# Altium footprint library Metric_SMD.PcbLib: 185 footprints (part 4 of 12)
Each footprint in its own frame and in the unit in brackets; x right, y up, seen from the top. Pads: shape width x height; smd on the part's side, far side on the other; paste and mask are expansions set on the pad; w line width, h text height; cw(c..) or ccw(c..) is an arc to the next point about the centre after c.
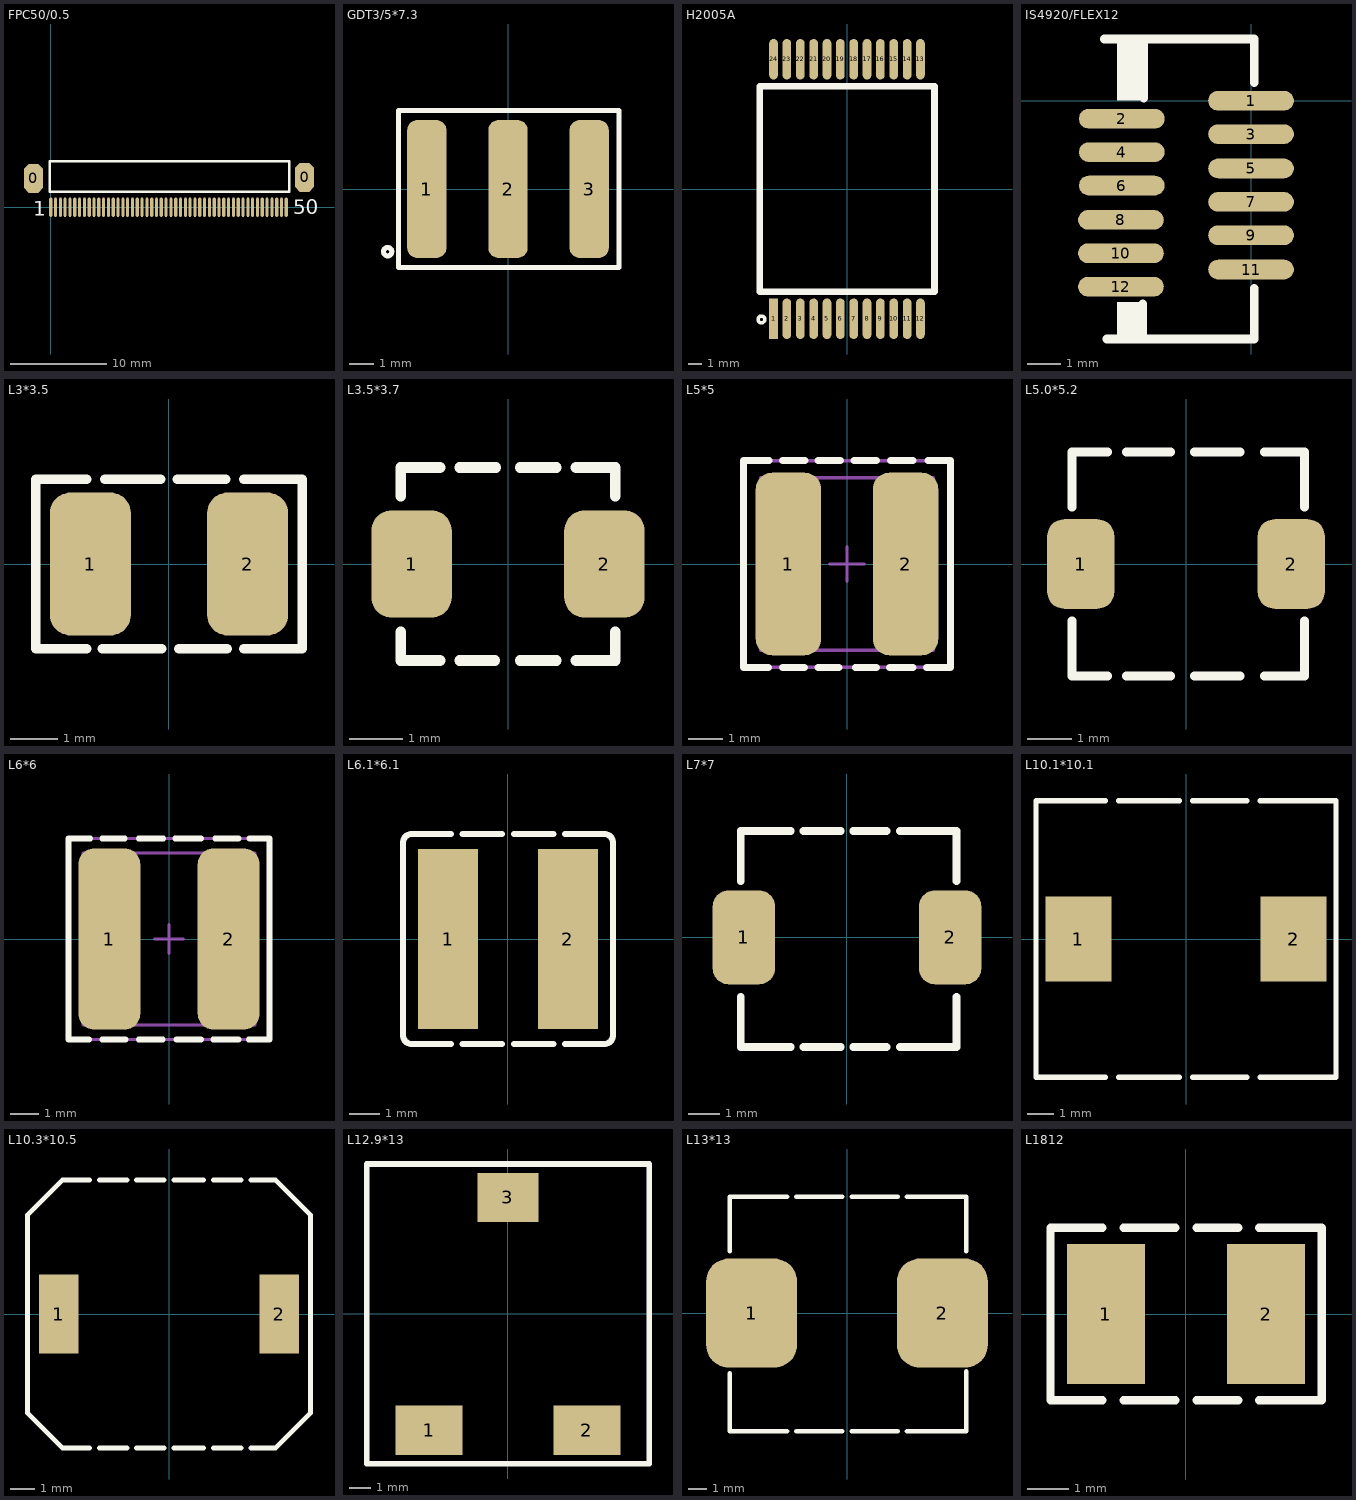
[diagram p3: the footprints below, top view; thin cyan lines are the x and y axes]

## FPC50/0.5 [mm] "FPC50pin,Single,0.5mm pitch"
height 1.5
pads (52):
  oct 2x3 smd: 0(-1.8,3) 0(26.4,3.1)
  oct 0.33x2 smd: 1(0,0) 2(0.5,0) 3(1,0) 4(1.5,0) 5(2,0) 6(2.5,0) 7(3,0) 8(3.5,0) 9(4,0) 10(4.5,0) 11(5,0) 12(5.5,0) 13(6,0) 14(6.5,0) 15(7,0) 16(7.5,0) 17(8,0) 18(8.5,0) 19(9,0) 20(9.5,0) 21(10,0) 22(10.5,0) 23(11,0) 24(11.5,0) 25(12,0) 26(12.5,0) 27(13,0) 28(13.5,0) 29(14,0) 30(14.5,0) 31(15,0) 32(15.5,0) 33(16,0) 34(16.5,0) 35(17,0) 36(17.5,0) 37(18,0) 38(18.5,0) 39(19,0) 40(19.5,0) 41(20,0) 42(20.5,0) 43(21,0) 44(21.5,0) 45(22,0) 46(22.5,0) 47(23,0) 48(23.5,0) 49(24,0) 50(24.5,0)
Top Overlay:
  lines w0.254: -0.1,1.6 24.8,1.6 24.8,4.8 -0.1,4.8 -0.1,1.6
  text "1" at -1.8,-0.9 h1.52
  text "50" at 25.2,-0.7 h1.52
3D body: height 2, standoff 0.1, extent -1.5,1.5 26,4.7
3D body: height 2.1, standoff 1.1, extent -1.4,3.6 25.8,5

## GDT3/5*7.3 [mm] "GDT,5*7.3mm,3pin"
height 5
pads (3):
  rrect50% 1.6x5.6 smd: 1(-3.3,0) 2(0,0) 3(3.3,0)
Top Overlay:
  circle w0.2: c-4.895,-2.55 r0.17
  lines w0.2: -4.449,-3.2 -4.449,3.2 4.517,3.2 4.517,-3.2 -4.449,-3.2
3D body: height 5, standoff 0, extent -3.608,-2.55 3.703,2.45

## H2005A [mm] "patch=0.99mm"
height 7
pads (24):
  rect 0.64x3 smd: 1(-5.445,-9.62)
  oval 0.64x3 smd: 2(-4.455,-9.62) 3(-3.465,-9.62) 4(-2.475,-9.62) 5(-1.485,-9.62) 6(-0.495,-9.62) 7(0.495,-9.62) 8(1.485,-9.62) 9(2.475,-9.62) 10(3.465,-9.62) 11(4.455,-9.62) 12(5.445,-9.62) 13(5.445,9.62) 14(4.455,9.62) 15(3.465,9.62) 16(2.475,9.62) 17(1.485,9.62) 18(0.495,9.62) 19(-0.495,9.62) 20(-1.485,9.62) 21(-2.475,9.62) 22(-3.465,9.62) 23(-4.455,9.62) 24(-5.445,9.62)
Top Overlay:
  circle w0.25: c-6.345,-9.67 r0.25
  lines w0.5: -6.47,-7.62 -6.47,7.62 6.48,7.62 6.48,-7.62 -6.47,-7.62
3D body: height 7, standoff 0.01, extent -6.645,-8.12 6.555,8.18

## IS4920/FLEX12 [mil] "IS4920扫描头，FLEX 12芯薄膜电缆座"
height 78.74
pads (12):
  oval 100x23 smd: 1(0,0) 2(-150.85,-21) 3(0,-39) 4(-150.85,-60) 5(0,-79) 6(-150.85,-99) 7(0,-118) 8(-151.85,-139) 9(0,-157) 10(-151.85,-178) 11(0,-197) 12(-151.85,-217)
Top Overlay:
  region: -124.41,-235.01 -156.41,-235.01 -156.41,-278.01 -124.41,-278.01
  region: -122.41,71.99 -156.41,71.99 -156.41,-0.01 -122.41,-0.01
  lines w10: -171.41,72 3.59,72 3.59,21 ; -168.41,-278 3.59,-278 3.59,-219 ; -126.41,-278 -126.41,-237 ; -125.41,3 -125.41,72

## L3*3.5 [mm] "磁罐电感3x3.5mm厚3mm表贴电感"
height 3
pads (2):
  rrect50% 1.7x3 smd: 1(-1.65,0) 2(1.65,0)
Top Overlay:
  lines w0.2: -1.727,-1.778 -2.794,-1.778 -2.794,1.778 -1.727,1.778 ; -1.397,-1.778 -0.152,-1.778 ; -1.346,1.778 -0.178,1.778 ; 0.178,1.778 1.194,1.778 ; 0.203,-1.778 1.219,-1.778 ; 1.575,-1.778 2.794,-1.778 2.794,1.778 1.575,1.778
3D body: height 0.6, standoff 0, extent -1.444,-1.5 1.544,1.494
3D body: height 4.6, standoff 4, extent -1.444,-1.5 1.544,1.494
3D body: height 4, standoff 0.6, extent -1.046,-0.9 0.946,1.096

## L3.5*3.7 [mm] "磁罐电感3.5*3.7mm厚1.2mm表贴电感"
height 1.2
pads (2):
  rrect50% 1.5x2 smd: 1(-1.8,0) 2(1.8,0)
Top Overlay:
  lines w0.2: -2,-1.27 -2,-1.8 -1.27,-1.8 ; -2,1.27 -2,1.8 -1.27,1.8 ; -0.9,-1.8 -0.25,-1.8 ; -0.9,1.8 -0.229,1.8 ; 0.229,-1.8 0.9,-1.8 ; 0.229,1.8 0.9,1.8 ; 1.27,-1.8 2,-1.8 2,-1.27 ; 1.27,1.8 2,1.8 2,1.27
3D body: height 4, standoff 0.6, extent -1.296,-0.9 0.696,1.096
3D body: height 4.6, standoff 4, extent -1.694,-1.5 1.294,1.494
3D body: height 0.6, standoff 0, extent -1.694,-1.5 1.294,1.494

## L5*5 [mm] "SMD Power Inductor, 2-Leads, Body 5x5mm(MAX)"
height 3
pads (2):
  rrect50% 1.9x5.3 smd: 1(-1.7,0) 2(1.7,0)
Top Overlay:
  lines w0.2: -2.276,-3 -3,-3 -3,3 -2.255,3 ; -1.876,-3 -1.229,-3 ; -1.876,3 -1.22,3 ; -0.837,-3 -0.227,-3 ; -0.837,3 -0.193,3 ; 0.206,3 0.85,3 ; 0.238,-3 0.85,-3 ; 1.232,-3 1.916,-3 ; 1.259,3 1.916,3 ; 2.301,-3 3,-3 3,3 2.345,3
Mechanical 13:
  lines w0.1: -2.5,-2.5 -2.5,2.5 2.5,2.5 2.5,-2.5 -2.5,-2.5
Mechanical 15:
  lines w0.1: -0.5,0 0.5,0 ; 0,-0.5 0,0.5 ; -3,-3 -3,3 3,3 3,-3 -3,-3
3D body: height 3, standoff 0, extent -2.5,-2.5 2.5,2.5

## L5.0*5.2 [mm] "磁罐电感5.0*5.2mm，厚2.2mm表贴电感"
height 2.2
pads (2):
  rrect50% 1.5x2 smd: 1(-2.35,0) 2(2.35,0)
Top Overlay:
  lines w0.2: -2.55,-1.27 -2.55,-2.5 -1.75,-2.5 ; -2.55,1.27 -2.55,2.5 -1.75,2.5 ; -1.334,-2.5 -0.35,-2.5 ; -1.334,2.5 -0.35,2.5 ; 0.19,-2.5 1.206,-2.5 ; 0.19,2.5 1.206,2.5 ; 1.75,-2.5 2.65,-2.5 2.65,-1.27 ; 1.75,2.5 2.65,2.5 2.65,1.27
3D body: height 4, standoff 0.6, extent -1.187,-1.016 1.079,0.98
3D body: height 4.6, standoff 4, extent -2.244,-1.5 2.222,1.494
3D body: height 0.6, standoff 0, extent -2.244,-1.5 2.222,1.494

## L6*6 [mm] "SMD Power Inductor, 2-Leads, Body 6x6mm(MAX)"
height 3
pads (2):
  rrect50% 2.15x6.3 smd: 1(-2.075,0) 2(2.075,0)
Top Overlay:
  lines w0.2: -2.785,-3.5 -3.5,-3.5 -3.5,3.5 -2.747,3.5 ; -2.323,-3.5 -1.513,-3.5 ; -2.323,3.5 -1.539,3.5 ; -1.051,-3.5 -0.215,-3.5 ; -1.051,3.5 -0.2,3.5 ; 0.222,3.5 1.111,3.5 ; 0.26,-3.5 1.111,-3.5 ; 1.545,-3.5 2.421,-3.5 ; 1.609,3.5 2.421,3.5 ; 2.778,-3.5 3.5,-3.5 3.5,3.5 2.804,3.5
Mechanical 13:
  lines w0.1: -3,-3 -3,3 3,3 3,-3 -3,-3
Mechanical 15:
  lines w0.1: -0.5,0 0.5,0 ; 0,-0.5 0,0.5 ; -3.5,-3.5 -3.5,3.5 3.5,3.5 3.5,-3.5 -3.5,-3.5
3D body: height 3, standoff 0, extent -3,-3 3,3

## L6.1*6.1 [mm]
height 3.2
pads (2):
  rect 2x6 smd: 1(-2,0) 2(2,0)
Top Overlay:
  lines w0.2: -1.9,-3.5 -3.2,-3.5 cw(c-3.2,-3.2) -3.5,-3.2 -3.5,3.2 cw(c-3.2,3.2) -3.2,3.5 -1.9,3.5 ; -1.524,-3.5 -0.2,-3.5 ; -1.524,3.5 -0.2,3.5 ; 0.2,-3.5 1.524,-3.5 ; 0.2,3.5 1.524,3.5 ; 1.9,-3.5 3.2,-3.5 ccw(c3.2,-3.2) 3.5,-3.2 3.5,3.2 ccw(c3.2,3.2) 3.2,3.5 1.9,3.5
3D body: height 3.2, standoff 0, extent -3.378,-3.378 3.327,3.404

## L7*7 [mm] "方底圆形磁罐7x7厚4mm表贴电感"
height 4
pads (2):
  rrect50% 2x3 smd: 1(-3.3,0) 2(3.3,0)
Top Overlay:
  lines w0.254: -3.4,-1.9 -3.4,-3.5 -1.8,-3.5 ; -3.4,1.8 -3.4,3.4 -1.8,3.4 ; -1.397,-3.5 -0.2,-3.5 ; -1.397,3.4 -0.2,3.4 ; 0.2,-3.5 1.27,-3.5 ; 0.2,3.4 1.27,3.4 ; 1.7,-3.5 3.5,-3.5 3.5,-1.9 ; 1.7,3.4 3.5,3.4 3.5,1.8

## L10.1*10.1 [mm] "10.1mmX10.1mm"
height 4.8
pads (2):
  rect 2.5x3.2 smd: 1(-4.05,0) 2(4.05,0)
Top Overlay:
  lines w0.203: -3.048,-5.2 -5.65,-5.2 -5.65,5.2 -3.048,5.2 ; -2.54,-5.2 -0.254,-5.2 ; -2.54,5.2 -0.254,5.2 ; 0.254,-5.2 2.286,-5.2 ; 0.254,5.2 2.286,5.2 ; 2.794,-5.2 5.65,-5.2 5.65,5.2 2.794,5.2
3D body "Coilcraft-MSS1038-DEFAULT.STEP": height 3.9, standoff -0.1, extent -5.175,-5.328 5.125,4.872

## L10.3*10.5 [mm] "sumida公司功率电感封装,10.3*10.5mm"
height 5.1
pads (2):
  rect 1.6x3.2 smd: 1(-4.45,0) 2(4.45,0)
Top Overlay:
  lines w0.203: -3.2,-5.4 -4.3,-5.4 -5.7,-4 -5.7,4 -4.3,5.4 -3.2,5.4 ; -2.8,-5.4 -1.7,-5.4 ; -2.8,5.4 -1.7,5.4 ; -1.3,-5.4 -0.2,-5.4 ; -1.3,5.4 -0.2,5.4 ; 0.2,-5.4 1.4,-5.4 ; 0.2,5.4 1.4,5.4 ; 1.8,-5.4 2.9,-5.4 ; 1.8,5.4 2.9,5.4 ; 3.3,-5.4 4.3,-5.4 5.7,-4 5.7,4 4.3,5.4 3.3,5.4

## L12.9*13 [mm] "12.9mm*13mm"
height 6
pads (3):
  rect 3.07x2.26 smd: 1(-3.605,-5.32) 2(3.605,-5.32)
  rect 2.77x2.26 smd: 3(0,5.32)
Top Overlay:
  lines w0.254: -6.45,-6.85 -6.45,6.85 6.45,6.85 6.45,-6.85 -6.45,-6.85
3D body: height 6, standoff 0, extent -6.45,-6.55 6.45,6.55

## L13*13 [mm] "方形磁罐13x13厚6mm表贴电感MSS1260等"
height 6
pads (2):
  rrect50% 5x6 smd: 1(-5.25,0) 2(5.25,0)
Top Overlay:
  lines w0.254: -6.45,-3.3 -6.45,-6.5 -3.302,-6.5 ; -6.45,3.4 -6.45,6.4 -3.302,6.4 ; -2.794,-6.5 -0.254,-6.5 ; -2.794,6.4 -0.254,6.4 ; 0.254,-6.5 2.794,-6.5 ; 0.254,6.4 2.794,6.4 ; 3.302,-6.5 6.55,-6.5 6.55,-3.2 ; 3.302,6.4 6.55,6.4 6.55,3.4
3D body: height 6, standoff 0, extent -6.05,-6 5.903,5.976
3D body: height 6.01, standoff 0, extent -5.05,-5 4.911,4.98
3D body: height 6.02, standoff 0, extent -4.05,-4 3.918,3.984

## L1812 [mm] "贴片电感"
pads (2):
  rect 1.9x3.4 smd: 1(-1.95,0) 2(1.95,0)
Top Overlay:
  lines w0.2: -2.032,-2.1 -3.3,-2.1 -3.3,2.1 -2.032,2.1 ; -1.524,-2.1 -0.254,-2.1 ; -1.524,2.1 -0.254,2.1 ; 0.254,-2.1 1.27,-2.1 ; 0.254,2.1 1.27,2.1 ; 1.778,-2.1 3.302,-2.1 3.302,2.1 1.778,2.1